# Altium schematic symbol library jlcpcb_2025_04_capacitors_extended_1206.schlib: 2503 symbols (part 8 of 14) (continued)
## CC1206KRX7R9BB333
designator C?  Capacitance: 33nF  (hidden comment: *)
Capacitor, Ceramic (MLCC), 33nF, ±10%, 50V, X7R, ±10%, SMD 1206; Manufacturer: YAGEO; Manufacturer Part Number: CC1206KRX7R9BB333; Package Size: 1206; JLCPCB Basic Part: No; JLCPCB Part Number: C541487; Supplier 1: LCSC; Category: Capacitors - MLCC; Supplier Part Number 1: C541487; Tolerance: ±10%; Voltage Rating: 50V; Temperature Coefficient: X7R; RoHS: Yes; ComponentLink1Description: Datasheet; ComponentLink1URL: https://wmsc.lcsc.com/wmsc/upload/file/pdf/v2/lcsc/2006151140_YAGEO-CC1206KRX7R9BB333_C541487.pdf; ComponentLink2Description: JLCPCB Part URL; ComponentLink2URL: https://jlcpcb.com/partdetail/C541487; ComponentLink3Description: LCSC Part URL; ComponentLink3URL: https://lcsc.com/product-detail/Multilayer-Ceramic-Capacitors-MLCC---SMD-SMT_YAGEO-YAGEO-CC1206KRX7R9BB333_C541487.html
footprint CAP-1206 (1206 (3216M) Capacitor)
pins: 1, 2

## CC1206KRX7R9BB334
designator C?  Capacitance: 330nF  (hidden comment: *)
Capacitor, Ceramic (MLCC), 330nF, ±10%, 50V, X7R, ±10%, SMD 1206; Manufacturer: YAGEO; Manufacturer Part Number: CC1206KRX7R9BB334; Package Size: 1206; JLCPCB Basic Part: No; JLCPCB Part Number: C274377; Supplier 1: LCSC; Category: Capacitors - MLCC; Supplier Part Number 1: C274377; Tolerance: ±10%; Voltage Rating: 50V; Temperature Coefficient: X7R; RoHS: Yes; ComponentLink1Description: Datasheet; ComponentLink1URL: https://wmsc.lcsc.com/wmsc/upload/file/pdf/v2/lcsc/2304140030_YAGEO-CC1206KRX7R9BB334_C274377.pdf; ComponentLink2Description: JLCPCB Part URL; ComponentLink2URL: https://jlcpcb.com/partdetail/C274377; ComponentLink3Description: LCSC Part URL; ComponentLink3URL: https://lcsc.com/product-detail/Multilayer-Ceramic-Capacitors-MLCC---SMD-SMT_YAGEO-YAGEO-CC1206KRX7R9BB334_C274377.html
footprint CAP-1206 (1206 (3216M) Capacitor)
pins: 1, 2

## CC1206KRX7R9BB391
designator C?  Capacitance: 390pF  (hidden comment: *)
Capacitor, Ceramic (MLCC), 390pF, ±10%, 50V, X7R, ±10%, SMD 1206; Manufacturer: YAGEO; Manufacturer Part Number: CC1206KRX7R9BB391; Package Size: 1206; JLCPCB Basic Part: No; JLCPCB Part Number: C527355; Supplier 1: LCSC; Category: Capacitors - MLCC; Supplier Part Number 1: C527355; Tolerance: ±10%; Voltage Rating: 50V; Temperature Coefficient: X7R; RoHS: Yes; ComponentLink1Description: Datasheet; ComponentLink1URL: https://wmsc.lcsc.com/wmsc/upload/file/pdf/v2/lcsc/2006101836_YAGEO-CC1206KRX7R9BB391_C527355.pdf; ComponentLink2Description: JLCPCB Part URL; ComponentLink2URL: https://jlcpcb.com/partdetail/C527355; ComponentLink3Description: LCSC Part URL; ComponentLink3URL: https://lcsc.com/product-detail/Multilayer-Ceramic-Capacitors-MLCC---SMD-SMT_YAGEO-YAGEO-CC1206KRX7R9BB391_C527355.html
footprint CAP-1206 (1206 (3216M) Capacitor)
pins: 1, 2

## CC1206KRX7R9BB392
designator C?  Capacitance: 3.9nF  (hidden comment: *)
Capacitor, Ceramic (MLCC), 3.9nF, ±10%, 50V, X7R, ±10%, SMD 1206; Manufacturer: YAGEO; Manufacturer Part Number: CC1206KRX7R9BB392; Package Size: 1206; JLCPCB Basic Part: No; JLCPCB Part Number: C527356; Supplier 1: LCSC; Category: Capacitors - MLCC; Supplier Part Number 1: C527356; Tolerance: ±10%; Voltage Rating: 50V; Temperature Coefficient: X7R; RoHS: Yes; ComponentLink1Description: Datasheet; ComponentLink1URL: https://wmsc.lcsc.com/wmsc/upload/file/pdf/v2/lcsc/2005222232_YAGEO-CC1206KRX7R9BB392_C527356.pdf; ComponentLink2Description: JLCPCB Part URL; ComponentLink2URL: https://jlcpcb.com/partdetail/C527356; ComponentLink3Description: LCSC Part URL; ComponentLink3URL: https://lcsc.com/product-detail/Multilayer-Ceramic-Capacitors-MLCC---SMD-SMT_YAGEO-YAGEO-CC1206KRX7R9BB392_C527356.html
footprint CAP-1206 (1206 (3216M) Capacitor)
pins: 1, 2

## CC1206KRX7R9BB393
designator C?  Capacitance: 39nF  (hidden comment: *)
Capacitor, Ceramic (MLCC), 39nF, ±10%, 50V, X7R, ±10%, SMD 1206; Manufacturer: YAGEO; Manufacturer Part Number: CC1206KRX7R9BB393; Package Size: 1206; JLCPCB Basic Part: No; JLCPCB Part Number: C527357; Supplier 1: LCSC; Category: Capacitors - MLCC; Supplier Part Number 1: C527357; Tolerance: ±10%; Voltage Rating: 50V; Temperature Coefficient: X7R; RoHS: Yes; ComponentLink1Description: Datasheet; ComponentLink1URL: https://wmsc.lcsc.com/wmsc/upload/file/pdf/v2/lcsc/2007021837_YAGEO-CC1206KRX7R9BB393_C527357.pdf; ComponentLink2Description: JLCPCB Part URL; ComponentLink2URL: https://jlcpcb.com/partdetail/C527357; ComponentLink3Description: LCSC Part URL; ComponentLink3URL: https://lcsc.com/product-detail/Multilayer-Ceramic-Capacitors-MLCC---SMD-SMT_YAGEO-YAGEO-CC1206KRX7R9BB393_C527357.html
footprint CAP-1206 (1206 (3216M) Capacitor)
pins: 1, 2

## CC1206KRX7R9BB471
designator C?  Capacitance: 470pF  (hidden comment: *)
Capacitor, Ceramic (MLCC), 470pF, ±10%, 50V, X7R, ±10%, SMD 1206; Manufacturer: YAGEO; Manufacturer Part Number: CC1206KRX7R9BB471; Package Size: 1206; JLCPCB Basic Part: No; JLCPCB Part Number: C326670; Supplier 1: LCSC; Category: Capacitors - MLCC; Supplier Part Number 1: C326670; Tolerance: ±10%; Voltage Rating: 50V; Temperature Coefficient: X7R; RoHS: Yes; ComponentLink1Description: Datasheet; ComponentLink1URL: https://wmsc.lcsc.com/wmsc/upload/file/pdf/v2/lcsc/1811141241_YAGEO-CC1206KRX7R9BB471_C326670.pdf; ComponentLink2Description: JLCPCB Part URL; ComponentLink2URL: https://jlcpcb.com/partdetail/C326670; ComponentLink3Description: LCSC Part URL; ComponentLink3URL: https://lcsc.com/product-detail/Multilayer-Ceramic-Capacitors-MLCC---SMD-SMT_YAGEO-YAGEO-CC1206KRX7R9BB471_C326670.html
footprint CAP-1206 (1206 (3216M) Capacitor)
pins: 1, 2

## CC1206KRX7R9BB472
designator C?  Capacitance: 4.7nF  (hidden comment: *)
Capacitor, Ceramic (MLCC), 4.7nF, ±10%, 50V, X7R, ±10%, SMD 1206; Manufacturer: YAGEO; Manufacturer Part Number: CC1206KRX7R9BB472; Package Size: 1206; JLCPCB Basic Part: No; JLCPCB Part Number: C107208; Supplier 1: LCSC; Category: Capacitors - MLCC; Supplier Part Number 1: C107208; Tolerance: ±10%; Voltage Rating: 50V; Temperature Coefficient: X7R; RoHS: Yes; ComponentLink1Description: Datasheet; ComponentLink1URL: https://wmsc.lcsc.com/wmsc/upload/file/pdf/v2/lcsc/2304140030_YAGEO-CC1206KRX7R9BB472_C107208.pdf; ComponentLink2Description: JLCPCB Part URL; ComponentLink2URL: https://jlcpcb.com/partdetail/C107208; ComponentLink3Description: LCSC Part URL; ComponentLink3URL: https://lcsc.com/product-detail/Multilayer-Ceramic-Capacitors-MLCC---SMD-SMT_YAGEO-YAGEO-CC1206KRX7R9BB472_C107208.html
footprint CAP-1206 (1206 (3216M) Capacitor)
pins: 1, 2

## CC1206KRX7R9BB473
designator C?  Capacitance: 47nF  (hidden comment: *)
Capacitor, Ceramic (MLCC), 47nF, ±10%, 50V, X7R, ±10%, SMD 1206; Manufacturer: YAGEO; Manufacturer Part Number: CC1206KRX7R9BB473; Package Size: 1206; JLCPCB Basic Part: No; JLCPCB Part Number: C107209; Supplier 1: LCSC; Category: Capacitors - MLCC; Supplier Part Number 1: C107209; Tolerance: ±10%; Voltage Rating: 50V; Temperature Coefficient: X7R; RoHS: Yes; ComponentLink1Description: Datasheet; ComponentLink1URL: https://wmsc.lcsc.com/wmsc/upload/file/pdf/v2/lcsc/2304140030_YAGEO-CC1206KRX7R9BB473_C107209.pdf; ComponentLink2Description: JLCPCB Part URL; ComponentLink2URL: https://jlcpcb.com/partdetail/C107209; ComponentLink3Description: LCSC Part URL; ComponentLink3URL: https://lcsc.com/product-detail/Multilayer-Ceramic-Capacitors-MLCC---SMD-SMT_YAGEO-YAGEO-CC1206KRX7R9BB473_C107209.html
footprint CAP-1206 (1206 (3216M) Capacitor)
pins: 1, 2

## CC1206KRX7R9BB561
designator C?  Capacitance: 560pF  (hidden comment: *)
Capacitor, Ceramic (MLCC), 560pF, ±10%, 50V, X7R, ±10%, SMD 1206; Manufacturer: YAGEO; Manufacturer Part Number: CC1206KRX7R9BB561; Package Size: 1206; JLCPCB Basic Part: No; JLCPCB Part Number: C541485; Supplier 1: LCSC; Category: Capacitors - MLCC; Supplier Part Number 1: C541485; Tolerance: ±10%; Voltage Rating: 50V; Temperature Coefficient: X7R; RoHS: Yes; ComponentLink1Description: Datasheet; ComponentLink1URL: https://wmsc.lcsc.com/wmsc/upload/file/pdf/v2/lcsc/2006151140_YAGEO-CC1206KRX7R9BB561_C541485.pdf; ComponentLink2Description: JLCPCB Part URL; ComponentLink2URL: https://jlcpcb.com/partdetail/C541485; ComponentLink3Description: LCSC Part URL; ComponentLink3URL: https://lcsc.com/product-detail/Multilayer-Ceramic-Capacitors-MLCC---SMD-SMT_YAGEO-YAGEO-CC1206KRX7R9BB561_C541485.html
footprint CAP-1206 (1206 (3216M) Capacitor)
pins: 1, 2

## CC1206KRX7R9BB562
designator C?  Capacitance: 5.6nF  (hidden comment: *)
Capacitor, Ceramic (MLCC), 5.6nF, ±10%, 50V, X7R, ±10%, SMD 1206; Manufacturer: YAGEO; Manufacturer Part Number: CC1206KRX7R9BB562; Package Size: 1206; JLCPCB Basic Part: No; JLCPCB Part Number: C327097; Supplier 1: LCSC; Category: Capacitors - MLCC; Supplier Part Number 1: C327097; Tolerance: ±10%; Voltage Rating: 50V; Temperature Coefficient: X7R; RoHS: Yes; ComponentLink1Description: Datasheet; ComponentLink1URL: https://wmsc.lcsc.com/wmsc/upload/file/pdf/v2/lcsc/2311211121_YAGEO-CC1206KRX7R9BB562_C327097.pdf; ComponentLink2Description: JLCPCB Part URL; ComponentLink2URL: https://jlcpcb.com/partdetail/C327097; ComponentLink3Description: LCSC Part URL; ComponentLink3URL: https://lcsc.com/product-detail/Multilayer-Ceramic-Capacitors-MLCC---SMD-SMT_YAGEO-YAGEO-CC1206KRX7R9BB562_C327097.html
footprint CAP-1206 (1206 (3216M) Capacitor)
pins: 1, 2

## CC1206KRX7R9BB563
designator C?  Capacitance: 56nF  (hidden comment: *)
Capacitor, Ceramic (MLCC), 56nF, ±10%, 50V, X7R, ±10%, SMD 1206; Manufacturer: YAGEO; Manufacturer Part Number: CC1206KRX7R9BB563; Package Size: 1206; JLCPCB Basic Part: No; JLCPCB Part Number: C541489; Supplier 1: LCSC; Category: Capacitors - MLCC; Supplier Part Number 1: C541489; Tolerance: ±10%; Voltage Rating: 50V; Temperature Coefficient: X7R; RoHS: Yes; ComponentLink1Description: Datasheet; ComponentLink1URL: https://wmsc.lcsc.com/wmsc/upload/file/pdf/v2/lcsc/2006151140_YAGEO-CC1206KRX7R9BB563_C541489.pdf; ComponentLink2Description: JLCPCB Part URL; ComponentLink2URL: https://jlcpcb.com/partdetail/C541489; ComponentLink3Description: LCSC Part URL; ComponentLink3URL: https://lcsc.com/product-detail/Multilayer-Ceramic-Capacitors-MLCC---SMD-SMT_YAGEO-YAGEO-CC1206KRX7R9BB563_C541489.html
footprint CAP-1206 (1206 (3216M) Capacitor)
pins: 1, 2

## CC1206KRX7R9BB682
designator C?  Capacitance: 6.8nF  (hidden comment: *)
Capacitor, Ceramic (MLCC), 6.8nF, ±10%, 50V, X7R, ±10%, SMD 1206; Manufacturer: YAGEO; Manufacturer Part Number: CC1206KRX7R9BB682; Package Size: 1206; JLCPCB Basic Part: No; JLCPCB Part Number: C113909; Supplier 1: LCSC; Category: Capacitors - MLCC; Supplier Part Number 1: C113909; Tolerance: ±10%; Voltage Rating: 50V; Temperature Coefficient: X7R; RoHS: Yes; ComponentLink1Description: Datasheet; ComponentLink1URL: https://wmsc.lcsc.com/wmsc/upload/file/pdf/v2/lcsc/2304140030_YAGEO-CC1206KRX7R9BB682_C113909.pdf; ComponentLink2Description: JLCPCB Part URL; ComponentLink2URL: https://jlcpcb.com/partdetail/C113909; ComponentLink3Description: LCSC Part URL; ComponentLink3URL: https://lcsc.com/product-detail/Multilayer-Ceramic-Capacitors-MLCC---SMD-SMT_YAGEO-YAGEO-CC1206KRX7R9BB682_C113909.html
footprint CAP-1206 (1206 (3216M) Capacitor)
pins: 1, 2

## CC1206KRX7R9BB683
designator C?  Capacitance: 68nF  (hidden comment: *)
Capacitor, Ceramic (MLCC), 68nF, ±10%, 50V, X7R, ±10%, SMD 1206; Manufacturer: YAGEO; Manufacturer Part Number: CC1206KRX7R9BB683; Package Size: 1206; JLCPCB Basic Part: No; JLCPCB Part Number: C107210; Supplier 1: LCSC; Category: Capacitors - MLCC; Supplier Part Number 1: C107210; Tolerance: ±10%; Voltage Rating: 50V; Temperature Coefficient: X7R; RoHS: Yes; ComponentLink1Description: Datasheet; ComponentLink1URL: https://wmsc.lcsc.com/wmsc/upload/file/pdf/v2/lcsc/2304140030_YAGEO-CC1206KRX7R9BB683_C107210.pdf; ComponentLink2Description: JLCPCB Part URL; ComponentLink2URL: https://jlcpcb.com/partdetail/C107210; ComponentLink3Description: LCSC Part URL; ComponentLink3URL: https://lcsc.com/product-detail/Multilayer-Ceramic-Capacitors-MLCC---SMD-SMT_YAGEO-YAGEO-CC1206KRX7R9BB683_C107210.html
footprint CAP-1206 (1206 (3216M) Capacitor)
pins: 1, 2

## CC1206KRX7R9BB821
designator C?  Capacitance: 820pF  (hidden comment: *)
Capacitor, Ceramic (MLCC), 820pF, ±10%, 50V, X7R, ±10%, SMD 1206; Manufacturer: YAGEO; Manufacturer Part Number: CC1206KRX7R9BB821; Package Size: 1206; JLCPCB Basic Part: No; JLCPCB Part Number: C541486; Supplier 1: LCSC; Category: Capacitors - MLCC; Supplier Part Number 1: C541486; Tolerance: ±10%; Voltage Rating: 50V; Temperature Coefficient: X7R; RoHS: Yes; ComponentLink1Description: Datasheet; ComponentLink1URL: https://wmsc.lcsc.com/wmsc/upload/file/pdf/v2/lcsc/2006151140_YAGEO-CC1206KRX7R9BB821_C541486.pdf; ComponentLink2Description: JLCPCB Part URL; ComponentLink2URL: https://jlcpcb.com/partdetail/C541486; ComponentLink3Description: LCSC Part URL; ComponentLink3URL: https://lcsc.com/product-detail/Multilayer-Ceramic-Capacitors-MLCC---SMD-SMT_YAGEO-YAGEO-CC1206KRX7R9BB821_C541486.html
footprint CAP-1206 (1206 (3216M) Capacitor)
pins: 1, 2

## CC1206KRX7R9BB822
designator C?  Capacitance: 8.2nF  (hidden comment: *)
Capacitor, Ceramic (MLCC), 8.2nF, ±10%, 50V, X7R, ±10%, SMD 1206; Manufacturer: YAGEO; Manufacturer Part Number: CC1206KRX7R9BB822; Package Size: 1206; JLCPCB Basic Part: No; JLCPCB Part Number: C527358; Supplier 1: LCSC; Category: Capacitors - MLCC; Supplier Part Number 1: C527358; Tolerance: ±10%; Voltage Rating: 50V; Temperature Coefficient: X7R; RoHS: Yes; ComponentLink1Description: Datasheet; ComponentLink1URL: https://wmsc.lcsc.com/wmsc/upload/file/pdf/v2/lcsc/2005222143_YAGEO-CC1206KRX7R9BB822_C527358.pdf; ComponentLink2Description: JLCPCB Part URL; ComponentLink2URL: https://jlcpcb.com/partdetail/C527358; ComponentLink3Description: LCSC Part URL; ComponentLink3URL: https://lcsc.com/product-detail/Multilayer-Ceramic-Capacitors-MLCC---SMD-SMT_YAGEO-YAGEO-CC1206KRX7R9BB822_C527358.html
footprint CAP-1206 (1206 (3216M) Capacitor)
pins: 1, 2

## CC1206KRX7R9BB823
designator C?  Capacitance: 82nF  (hidden comment: *)
Capacitor, Ceramic (MLCC), 82nF, ±10%, 50V, X7R, ±10%, SMD 1206; Manufacturer: YAGEO; Manufacturer Part Number: CC1206KRX7R9BB823; Package Size: 1206; JLCPCB Basic Part: No; JLCPCB Part Number: C527359; Supplier 1: LCSC; Category: Capacitors - MLCC; Supplier Part Number 1: C527359; Tolerance: ±10%; Voltage Rating: 50V; Temperature Coefficient: X7R; RoHS: Yes; ComponentLink1Description: Datasheet; ComponentLink1URL: https://wmsc.lcsc.com/wmsc/upload/file/pdf/v2/lcsc/2006031836_YAGEO-CC1206KRX7R9BB823_C527359.pdf; ComponentLink2Description: JLCPCB Part URL; ComponentLink2URL: https://jlcpcb.com/partdetail/C527359; ComponentLink3Description: LCSC Part URL; ComponentLink3URL: https://lcsc.com/product-detail/Multilayer-Ceramic-Capacitors-MLCC---SMD-SMT_YAGEO-YAGEO-CC1206KRX7R9BB823_C527359.html
footprint CAP-1206 (1206 (3216M) Capacitor)
pins: 1, 2

## CC1206KRX7RABB102
designator C?  Capacitance: 1nF  (hidden comment: *)
Capacitor, Ceramic (MLCC), 1nF, ±10%, 200V, X7R, ±10%, SMD 1206; Manufacturer: YAGEO; Manufacturer Part Number: CC1206KRX7RABB102; Package Size: 1206; JLCPCB Basic Part: No; JLCPCB Part Number: C113910; Supplier 1: LCSC; Category: Capacitors - MLCC; Supplier Part Number 1: C113910; Tolerance: ±10%; Voltage Rating: 200V; Temperature Coefficient: X7R; RoHS: Yes; ComponentLink1Description: Datasheet; ComponentLink1URL: https://wmsc.lcsc.com/wmsc/upload/file/pdf/v2/lcsc/2007141515_YAGEO-CC1206KRX7RABB102_C113910.pdf; ComponentLink2Description: JLCPCB Part URL; ComponentLink2URL: https://jlcpcb.com/partdetail/C113910; ComponentLink3Description: LCSC Part URL; ComponentLink3URL: https://lcsc.com/product-detail/Multilayer-Ceramic-Capacitors-MLCC---SMD-SMT_YAGEO-YAGEO-CC1206KRX7RABB102_C113910.html
footprint CAP-1206 (1206 (3216M) Capacitor)
pins: 1, 2

## CC1206KRX7RABB103
designator C?  Capacitance: 10nF  (hidden comment: *)
Capacitor, Ceramic (MLCC), 10nF, ±10%, 200V, X7R, ±10%, SMD 1206; Manufacturer: YAGEO; Manufacturer Part Number: CC1206KRX7RABB103; Package Size: 1206; JLCPCB Basic Part: No; JLCPCB Part Number: C326678; Supplier 1: LCSC; Category: Capacitors - MLCC; Supplier Part Number 1: C326678; Tolerance: ±10%; Voltage Rating: 200V; Temperature Coefficient: X7R; RoHS: Yes; ComponentLink1Description: Datasheet; ComponentLink1URL: https://wmsc.lcsc.com/wmsc/upload/file/pdf/v2/lcsc/1811141241_YAGEO-CC1206KRX7RABB103_C326678.pdf; ComponentLink2Description: JLCPCB Part URL; ComponentLink2URL: https://jlcpcb.com/partdetail/C326678; ComponentLink3Description: LCSC Part URL; ComponentLink3URL: https://lcsc.com/product-detail/Multilayer-Ceramic-Capacitors-MLCC---SMD-SMT_YAGEO-YAGEO-CC1206KRX7RABB103_C326678.html
footprint CAP-1206 (1206 (3216M) Capacitor)
pins: 1, 2

## CC1206KRX7RABB152
designator C?  Capacitance: 1.5nF  (hidden comment: *)
Capacitor, Ceramic (MLCC), 1.5nF, ±10%, 200V, X7R, ±10%, SMD 1206; Manufacturer: YAGEO; Manufacturer Part Number: CC1206KRX7RABB152; Package Size: 1206; JLCPCB Basic Part: No; JLCPCB Part Number: C527360; Supplier 1: LCSC; Category: Capacitors - MLCC; Supplier Part Number 1: C527360; Tolerance: ±10%; Voltage Rating: 200V; Temperature Coefficient: X7R; RoHS: Yes; ComponentLink1Description: Datasheet; ComponentLink1URL: https://wmsc.lcsc.com/wmsc/upload/file/pdf/v2/lcsc/2005262136_YAGEO-CC1206KRX7RABB152_C527360.pdf; ComponentLink2Description: JLCPCB Part URL; ComponentLink2URL: https://jlcpcb.com/partdetail/C527360; ComponentLink3Description: LCSC Part URL; ComponentLink3URL: https://lcsc.com/product-detail/Multilayer-Ceramic-Capacitors-MLCC---SMD-SMT_YAGEO-YAGEO-CC1206KRX7RABB152_C527360.html
footprint CAP-1206 (1206 (3216M) Capacitor)
pins: 1, 2

## CC1206KRX7RABB153
designator C?  Capacitance: 15nF  (hidden comment: *)
Capacitor, Ceramic (MLCC), 15nF, ±10%, 200V, X7R, ±10%, SMD 1206; Manufacturer: YAGEO; Manufacturer Part Number: CC1206KRX7RABB153; Package Size: 1206; JLCPCB Basic Part: No; JLCPCB Part Number: C527361; Supplier 1: LCSC; Category: Capacitors - MLCC; Supplier Part Number 1: C527361; Tolerance: ±10%; Voltage Rating: 200V; Temperature Coefficient: X7R; RoHS: Yes; ComponentLink1Description: Datasheet; ComponentLink1URL: https://wmsc.lcsc.com/wmsc/upload/file/pdf/v2/lcsc/2006031836_YAGEO-CC1206KRX7RABB153_C527361.pdf; ComponentLink2Description: JLCPCB Part URL; ComponentLink2URL: https://jlcpcb.com/partdetail/C527361; ComponentLink3Description: LCSC Part URL; ComponentLink3URL: https://lcsc.com/product-detail/Multilayer-Ceramic-Capacitors-MLCC---SMD-SMT_YAGEO-YAGEO-CC1206KRX7RABB153_C527361.html
footprint CAP-1206 (1206 (3216M) Capacitor)
pins: 1, 2

## CC1206KRX7RABB221
designator C?  Capacitance: 220pF  (hidden comment: *)
Capacitor, Ceramic (MLCC), 220pF, ±10%, 200V, X7R, ±10%, SMD 1206; Manufacturer: YAGEO; Manufacturer Part Number: CC1206KRX7RABB221; Package Size: 1206; JLCPCB Basic Part: No; JLCPCB Part Number: C326677; Supplier 1: LCSC; Category: Capacitors - MLCC; Supplier Part Number 1: C326677; Tolerance: ±10%; Voltage Rating: 200V; Temperature Coefficient: X7R; RoHS: Yes; ComponentLink1Description: Datasheet; ComponentLink1URL: https://wmsc.lcsc.com/wmsc/upload/file/pdf/v2/lcsc/1811061214_YAGEO-CC1206KRX7RABB221_C326677.pdf; ComponentLink2Description: JLCPCB Part URL; ComponentLink2URL: https://jlcpcb.com/partdetail/C326677; ComponentLink3Description: LCSC Part URL; ComponentLink3URL: https://lcsc.com/product-detail/Multilayer-Ceramic-Capacitors-MLCC---SMD-SMT_YAGEO-YAGEO-CC1206KRX7RABB221_C326677.html
footprint CAP-1206 (1206 (3216M) Capacitor)
pins: 1, 2

## CC1206KRX7RABB222
designator C?  Capacitance: 2.2nF  (hidden comment: *)
Capacitor, Ceramic (MLCC), 2.2nF, ±10%, 200V, X7R, ±10%, SMD 1206; Manufacturer: YAGEO; Manufacturer Part Number: CC1206KRX7RABB222; Package Size: 1206; JLCPCB Basic Part: No; JLCPCB Part Number: C326676; Supplier 1: LCSC; Category: Capacitors - MLCC; Supplier Part Number 1: C326676; Tolerance: ±10%; Voltage Rating: 200V; Temperature Coefficient: X7R; RoHS: Yes; ComponentLink1Description: Datasheet; ComponentLink1URL: https://wmsc.lcsc.com/wmsc/upload/file/pdf/v2/lcsc/1811091621_YAGEO-CC1206KRX7RABB222_C326676.pdf; ComponentLink2Description: JLCPCB Part URL; ComponentLink2URL: https://jlcpcb.com/partdetail/C326676; ComponentLink3Description: LCSC Part URL; ComponentLink3URL: https://lcsc.com/product-detail/Multilayer-Ceramic-Capacitors-MLCC---SMD-SMT_YAGEO-YAGEO-CC1206KRX7RABB222_C326676.html
footprint CAP-1206 (1206 (3216M) Capacitor)
pins: 1, 2

## CC1206KRX7RABB471
designator C?  Capacitance: 470pF  (hidden comment: *)
Capacitor, Ceramic (MLCC), 470pF, ±10%, 200V, X7R, ±10%, SMD 1206; Manufacturer: YAGEO; Manufacturer Part Number: CC1206KRX7RABB471; Package Size: 1206; JLCPCB Basic Part: No; JLCPCB Part Number: C277516; Supplier 1: LCSC; Category: Capacitors - MLCC; Supplier Part Number 1: C277516; Tolerance: ±10%; Voltage Rating: 200V; Temperature Coefficient: X7R; RoHS: Yes; ComponentLink1Description: Datasheet; ComponentLink1URL: https://wmsc.lcsc.com/wmsc/upload/file/pdf/v2/lcsc/2304140030_YAGEO-CC1206KRX7RABB471_C277516.pdf; ComponentLink2Description: JLCPCB Part URL; ComponentLink2URL: https://jlcpcb.com/partdetail/C277516; ComponentLink3Description: LCSC Part URL; ComponentLink3URL: https://lcsc.com/product-detail/Multilayer-Ceramic-Capacitors-MLCC---SMD-SMT_YAGEO-YAGEO-CC1206KRX7RABB471_C277516.html
footprint CAP-1206 (1206 (3216M) Capacitor)
pins: 1, 2

## CC1206KRX7RABB472
designator C?  Capacitance: 4.7nF  (hidden comment: *)
Capacitor, Ceramic (MLCC), 4.7nF, ±10%, 200V, X7R, ±10%, SMD 1206; Manufacturer: YAGEO; Manufacturer Part Number: CC1206KRX7RABB472; Package Size: 1206; JLCPCB Basic Part: No; JLCPCB Part Number: C326674; Supplier 1: LCSC; Category: Capacitors - MLCC; Supplier Part Number 1: C326674; Tolerance: ±10%; Voltage Rating: 200V; Temperature Coefficient: X7R; RoHS: Yes; ComponentLink1Description: Datasheet; ComponentLink1URL: https://wmsc.lcsc.com/wmsc/upload/file/pdf/v2/lcsc/1811061214_YAGEO-CC1206KRX7RABB472_C326674.pdf; ComponentLink2Description: JLCPCB Part URL; ComponentLink2URL: https://jlcpcb.com/partdetail/C326674; ComponentLink3Description: LCSC Part URL; ComponentLink3URL: https://lcsc.com/product-detail/Multilayer-Ceramic-Capacitors-MLCC---SMD-SMT_YAGEO-YAGEO-CC1206KRX7RABB472_C326674.html
footprint CAP-1206 (1206 (3216M) Capacitor)
pins: 1, 2

## CC1206KRX7RABB681
designator C?  Capacitance: 680pF  (hidden comment: *)
Capacitor, Ceramic (MLCC), 680pF, ±10%, 200V, X7R, ±10%, SMD 1206; Manufacturer: YAGEO; Manufacturer Part Number: CC1206KRX7RABB681; Package Size: 1206; JLCPCB Basic Part: No; JLCPCB Part Number: C326806; Supplier 1: LCSC; Category: Capacitors - MLCC; Supplier Part Number 1: C326806; Tolerance: ±10%; Voltage Rating: 200V; Temperature Coefficient: X7R; RoHS: Yes; ComponentLink1Description: Datasheet; ComponentLink1URL: https://wmsc.lcsc.com/wmsc/upload/file/pdf/v2/lcsc/1811061214_YAGEO-CC1206KRX7RABB681_C326806.pdf; ComponentLink2Description: JLCPCB Part URL; ComponentLink2URL: https://jlcpcb.com/partdetail/C326806; ComponentLink3Description: LCSC Part URL; ComponentLink3URL: https://lcsc.com/product-detail/Multilayer-Ceramic-Capacitors-MLCC---SMD-SMT_YAGEO-YAGEO-CC1206KRX7RABB681_C326806.html
footprint CAP-1206 (1206 (3216M) Capacitor)
pins: 1, 2

## CC1206KRX7RYBB102
designator C?  Capacitance: 1nF  (hidden comment: *)
Capacitor, Ceramic (MLCC), 1nF, ±10%, 250V, X7R, ±10%, SMD 1206; Manufacturer: YAGEO; Manufacturer Part Number: CC1206KRX7RYBB102; Package Size: 1206; JLCPCB Basic Part: No; JLCPCB Part Number: C107211; Supplier 1: LCSC; Category: Capacitors - MLCC; Supplier Part Number 1: C107211; Tolerance: ±10%; Voltage Rating: 250V; Temperature Coefficient: X7R; RoHS: Yes; ComponentLink1Description: Datasheet; ComponentLink1URL: https://wmsc.lcsc.com/wmsc/upload/file/pdf/v2/lcsc/2304140030_YAGEO-CC1206KRX7RYBB102_C107211.pdf; ComponentLink2Description: JLCPCB Part URL; ComponentLink2URL: https://jlcpcb.com/partdetail/C107211; ComponentLink3Description: LCSC Part URL; ComponentLink3URL: https://lcsc.com/product-detail/Multilayer-Ceramic-Capacitors-MLCC---SMD-SMT_YAGEO-YAGEO-CC1206KRX7RYBB102_C107211.html
footprint CAP-1206 (1206 (3216M) Capacitor)
pins: 1, 2

## CC1206KRX7RYBB103
designator C?  Capacitance: 10nF  (hidden comment: *)
Capacitor, Ceramic (MLCC), 10nF, ±10%, 250V, X7R, ±10%, SMD 1206; Manufacturer: YAGEO; Manufacturer Part Number: CC1206KRX7RYBB103; Package Size: 1206; JLCPCB Basic Part: No; JLCPCB Part Number: C326699; Supplier 1: LCSC; Category: Capacitors - MLCC; Supplier Part Number 1: C326699; Tolerance: ±10%; Voltage Rating: 250V; Temperature Coefficient: X7R; RoHS: Yes; ComponentLink1Description: Datasheet; ComponentLink1URL: https://wmsc.lcsc.com/wmsc/upload/file/pdf/v2/lcsc/1811061214_YAGEO-CC1206KRX7RYBB103_C326699.pdf; ComponentLink2Description: JLCPCB Part URL; ComponentLink2URL: https://jlcpcb.com/partdetail/C326699; ComponentLink3Description: LCSC Part URL; ComponentLink3URL: https://lcsc.com/product-detail/Multilayer-Ceramic-Capacitors-MLCC---SMD-SMT_YAGEO-YAGEO-CC1206KRX7RYBB103_C326699.html
footprint CAP-1206 (1206 (3216M) Capacitor)
pins: 1, 2

## CC1206KRX7RYBB153
designator C?  Capacitance: 15nF  (hidden comment: *)
Capacitor, Ceramic (MLCC), 15nF, ±10%, 250V, X7R, ±10%, SMD 1206; Manufacturer: YAGEO; Manufacturer Part Number: CC1206KRX7RYBB153; Package Size: 1206; JLCPCB Basic Part: No; JLCPCB Part Number: C326667; Supplier 1: LCSC; Category: Capacitors - MLCC; Supplier Part Number 1: C326667; Tolerance: ±10%; Voltage Rating: 250V; Temperature Coefficient: X7R; RoHS: Yes; ComponentLink1Description: Datasheet; ComponentLink1URL: https://wmsc.lcsc.com/wmsc/upload/file/pdf/v2/lcsc/1811151646_YAGEO-CC1206KRX7RYBB153_C326667.pdf; ComponentLink2Description: JLCPCB Part URL; ComponentLink2URL: https://jlcpcb.com/partdetail/C326667; ComponentLink3Description: LCSC Part URL; ComponentLink3URL: https://lcsc.com/product-detail/Multilayer-Ceramic-Capacitors-MLCC---SMD-SMT_YAGEO-YAGEO-CC1206KRX7RYBB153_C326667.html
footprint CAP-1206 (1206 (3216M) Capacitor)
pins: 1, 2

## CC1206KRX7RYBB222
designator C?  Capacitance: 2.2nF  (hidden comment: *)
Capacitor, Ceramic (MLCC), 2.2nF, ±10%, 250V, X7R, ±10%, SMD 1206; Manufacturer: YAGEO; Manufacturer Part Number: CC1206KRX7RYBB222; Package Size: 1206; JLCPCB Basic Part: No; JLCPCB Part Number: C113912; Supplier 1: LCSC; Category: Capacitors - MLCC; Supplier Part Number 1: C113912; Tolerance: ±10%; Voltage Rating: 250V; Temperature Coefficient: X7R; RoHS: Yes; ComponentLink1Description: Datasheet; ComponentLink1URL: https://wmsc.lcsc.com/wmsc/upload/file/pdf/v2/lcsc/2304140030_YAGEO-CC1206KRX7RYBB222_C113912.pdf; ComponentLink2Description: JLCPCB Part URL; ComponentLink2URL: https://jlcpcb.com/partdetail/C113912; ComponentLink3Description: LCSC Part URL; ComponentLink3URL: https://lcsc.com/product-detail/Multilayer-Ceramic-Capacitors-MLCC---SMD-SMT_YAGEO-YAGEO-CC1206KRX7RYBB222_C113912.html
footprint CAP-1206 (1206 (3216M) Capacitor)
pins: 1, 2

## CC1206KRX7RYBB332
designator C?  Capacitance: 3.3nF  (hidden comment: *)
Capacitor, Ceramic (MLCC), 3.3nF, ±10%, 250V, X7R, ±10%, SMD 1206; Manufacturer: YAGEO; Manufacturer Part Number: CC1206KRX7RYBB332; Package Size: 1206; JLCPCB Basic Part: No; JLCPCB Part Number: C326675; Supplier 1: LCSC; Category: Capacitors - MLCC; Supplier Part Number 1: C326675; Tolerance: ±10%; Voltage Rating: 250V; Temperature Coefficient: X7R; RoHS: Yes; ComponentLink1Description: Datasheet; ComponentLink1URL: https://wmsc.lcsc.com/wmsc/upload/file/pdf/v2/lcsc/1811151646_YAGEO-CC1206KRX7RYBB332_C326675.pdf; ComponentLink2Description: JLCPCB Part URL; ComponentLink2URL: https://jlcpcb.com/partdetail/C326675; ComponentLink3Description: LCSC Part URL; ComponentLink3URL: https://lcsc.com/product-detail/Multilayer-Ceramic-Capacitors-MLCC---SMD-SMT_YAGEO-YAGEO-CC1206KRX7RYBB332_C326675.html
footprint CAP-1206 (1206 (3216M) Capacitor)
pins: 1, 2

## CC1206KRX7RYBB471
designator C?  Capacitance: 470pF  (hidden comment: *)
Capacitor, Ceramic (MLCC), 470pF, ±10%, 250V, X7R, ±10%, SMD 1206; Manufacturer: YAGEO; Manufacturer Part Number: CC1206KRX7RYBB471; Package Size: 1206; JLCPCB Basic Part: No; JLCPCB Part Number: C107212; Supplier 1: LCSC; Category: Capacitors - MLCC; Supplier Part Number 1: C107212; Tolerance: ±10%; Voltage Rating: 250V; Temperature Coefficient: X7R; RoHS: Yes; ComponentLink1Description: Datasheet; ComponentLink1URL: https://wmsc.lcsc.com/wmsc/upload/file/pdf/v2/lcsc/2304140030_YAGEO-CC1206KRX7RYBB471_C107212.pdf; ComponentLink2Description: JLCPCB Part URL; ComponentLink2URL: https://jlcpcb.com/partdetail/C107212; ComponentLink3Description: LCSC Part URL; ComponentLink3URL: https://lcsc.com/product-detail/Multilayer-Ceramic-Capacitors-MLCC---SMD-SMT_YAGEO-YAGEO-CC1206KRX7RYBB471_C107212.html
footprint CAP-1206 (1206 (3216M) Capacitor)
pins: 1, 2

## CC1206KRX7RYBB472
designator C?  Capacitance: 4.7nF  (hidden comment: *)
Capacitor, Ceramic (MLCC), 4.7nF, ±10%, 250V, X7R, ±10%, SMD 1206; Manufacturer: YAGEO; Manufacturer Part Number: CC1206KRX7RYBB472; Package Size: 1206; JLCPCB Basic Part: No; JLCPCB Part Number: C326763; Supplier 1: LCSC; Category: Capacitors - MLCC; Supplier Part Number 1: C326763; Tolerance: ±10%; Voltage Rating: 250V; Temperature Coefficient: X7R; RoHS: Yes; ComponentLink1Description: Datasheet; ComponentLink1URL: https://wmsc.lcsc.com/wmsc/upload/file/pdf/v2/lcsc/1811151646_YAGEO-CC1206KRX7RYBB472_C326763.pdf; ComponentLink2Description: JLCPCB Part URL; ComponentLink2URL: https://jlcpcb.com/partdetail/C326763; ComponentLink3Description: LCSC Part URL; ComponentLink3URL: https://lcsc.com/product-detail/Multilayer-Ceramic-Capacitors-MLCC---SMD-SMT_YAGEO-YAGEO-CC1206KRX7RYBB472_C326763.html
footprint CAP-1206 (1206 (3216M) Capacitor)
pins: 1, 2

## CC1206KRX7RYBB561
designator C?  Capacitance: 560pF  (hidden comment: *)
Capacitor, Ceramic (MLCC), 560pF, ±10%, 250V, X7R, ±10%, SMD 1206; Manufacturer: YAGEO; Manufacturer Part Number: CC1206KRX7RYBB561; Package Size: 1206; JLCPCB Basic Part: No; JLCPCB Part Number: C527362; Supplier 1: LCSC; Category: Capacitors - MLCC; Supplier Part Number 1: C527362; Tolerance: ±10%; Voltage Rating: 250V; Temperature Coefficient: X7R; RoHS: Yes; ComponentLink1Description: Datasheet; ComponentLink1URL: https://wmsc.lcsc.com/wmsc/upload/file/pdf/v2/lcsc/2009180903_YAGEO-CC1206KRX7RYBB561_C527362.pdf; ComponentLink2Description: JLCPCB Part URL; ComponentLink2URL: https://jlcpcb.com/partdetail/C527362; ComponentLink3Description: LCSC Part URL; ComponentLink3URL: https://lcsc.com/product-detail/Multilayer-Ceramic-Capacitors-MLCC---SMD-SMT_YAGEO-YAGEO-CC1206KRX7RYBB561_C527362.html
footprint CAP-1206 (1206 (3216M) Capacitor)
pins: 1, 2

## CC1206MKX5R5BB107
designator C?  Capacitance: 100uF  (hidden comment: *)
Capacitor, Ceramic (MLCC), 100uF, ±20%, 6.3V, X5R, ±20%, SMD 1206; Manufacturer: YAGEO; Manufacturer Part Number: CC1206MKX5R5BB107; Package Size: 1206; JLCPCB Basic Part: No; JLCPCB Part Number: C110048; Supplier 1: LCSC; Category: Capacitors - MLCC; Supplier Part Number 1: C110048; Tolerance: ±20%; Voltage Rating: 6.3V; Temperature Coefficient: X5R; RoHS: Yes; ComponentLink1Description: Datasheet; ComponentLink1URL: https://wmsc.lcsc.com/wmsc/upload/file/pdf/v2/lcsc/2407081117_YAGEO-CC1206MKX5R5BB107_C110048.pdf; ComponentLink2Description: JLCPCB Part URL; ComponentLink2URL: https://jlcpcb.com/partdetail/C110048; ComponentLink3Description: LCSC Part URL; ComponentLink3URL: https://lcsc.com/product-detail/Multilayer-Ceramic-Capacitors-MLCC---SMD-SMT_YAGEO-YAGEO-CC1206MKX5R5BB107_C110048.html
footprint CAP-1206 (1206 (3216M) Capacitor)
pins: 1, 2

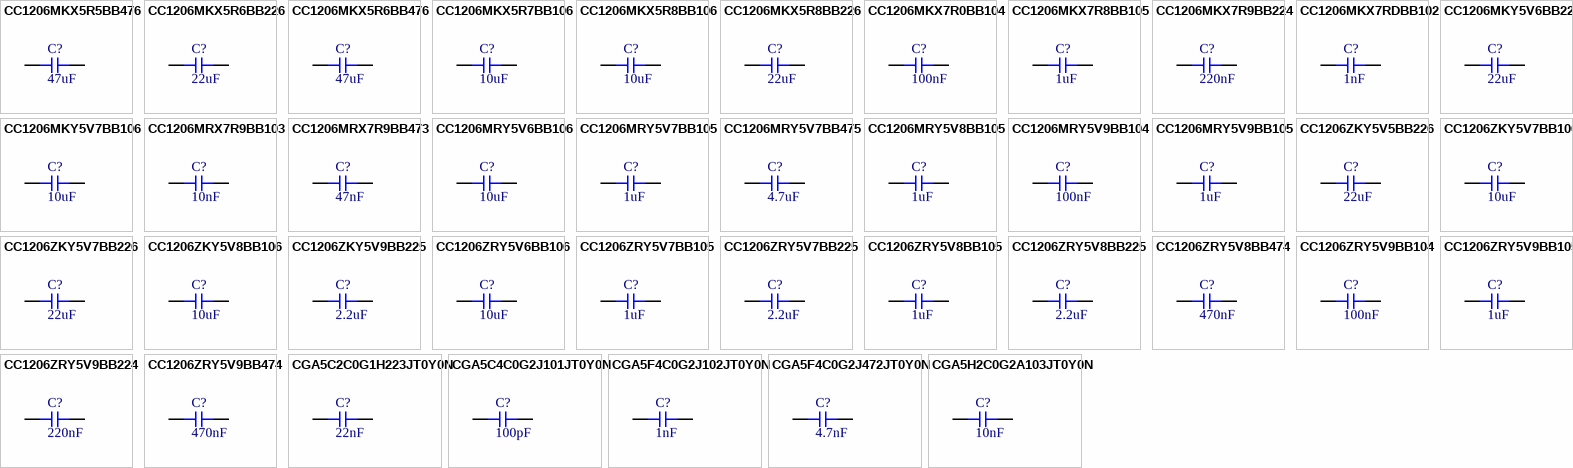
[diagram p34: symbols CC1206MKX5R5BB476 to CGA5H2C0G2A103JT0Y0N]

## CC1206MKX5R5BB476
designator C?  Capacitance: 47uF  (hidden comment: *)
Capacitor, Ceramic (MLCC), 47uF, ±20%, 6.3V, X5R, ±20%, SMD 1206; Manufacturer: YAGEO; Manufacturer Part Number: CC1206MKX5R5BB476; Package Size: 1206; JLCPCB Basic Part: No; JLCPCB Part Number: C110047; Supplier 1: LCSC; Category: Capacitors - MLCC; Supplier Part Number 1: C110047; Tolerance: ±20%; Voltage Rating: 6.3V; Temperature Coefficient: X5R; RoHS: Yes; ComponentLink1Description: Datasheet; ComponentLink1URL: https://wmsc.lcsc.com/wmsc/upload/file/pdf/v2/lcsc/2407081117_YAGEO-CC1206MKX5R5BB476_C110047.pdf; ComponentLink2Description: JLCPCB Part URL; ComponentLink2URL: https://jlcpcb.com/partdetail/C110047; ComponentLink3Description: LCSC Part URL; ComponentLink3URL: https://lcsc.com/product-detail/Multilayer-Ceramic-Capacitors-MLCC---SMD-SMT_YAGEO-YAGEO-CC1206MKX5R5BB476_C110047.html
footprint CAP-1206 (1206 (3216M) Capacitor)
pins: 1, 2

## CC1206MKX5R6BB226
designator C?  Capacitance: 22uF  (hidden comment: *)
Capacitor, Ceramic (MLCC), 22uF, ±20%, 10V, X5R, ±20%, SMD 1206; Manufacturer: YAGEO; Manufacturer Part Number: CC1206MKX5R6BB226; Package Size: 1206; JLCPCB Basic Part: No; JLCPCB Part Number: C723738; Supplier 1: LCSC; Category: Capacitors - MLCC; Supplier Part Number 1: C723738; Tolerance: ±20%; Voltage Rating: 10V; Temperature Coefficient: X5R; RoHS: Yes; ComponentLink1Description: Datasheet; ComponentLink1URL: https://wmsc.lcsc.com/wmsc/upload/file/pdf/v2/lcsc/2407081117_YAGEO-CC1206MKX5R6BB226_C723738.pdf; ComponentLink2Description: JLCPCB Part URL; ComponentLink2URL: https://jlcpcb.com/partdetail/C723738; ComponentLink3Description: LCSC Part URL; ComponentLink3URL: https://lcsc.com/product-detail/Multilayer-Ceramic-Capacitors-MLCC---SMD-SMT_YAGEO-YAGEO-CC1206MKX5R6BB226_C723738.html
footprint CAP-1206 (1206 (3216M) Capacitor)
pins: 1, 2

## CC1206MKX5R6BB476
designator C?  Capacitance: 47uF  (hidden comment: *)
Capacitor, Ceramic (MLCC), 47uF, ±20%, 10V, X5R, ±20%, SMD 1206; Manufacturer: YAGEO; Manufacturer Part Number: CC1206MKX5R6BB476; Package Size: 1206; JLCPCB Basic Part: No; JLCPCB Part Number: C513711; Supplier 1: LCSC; Category: Capacitors - MLCC; Supplier Part Number 1: C513711; Tolerance: ±20%; Voltage Rating: 10V; Temperature Coefficient: X5R; RoHS: Yes; ComponentLink1Description: Datasheet; ComponentLink1URL: https://wmsc.lcsc.com/wmsc/upload/file/pdf/v2/lcsc/2407081117_YAGEO-CC1206MKX5R6BB476_C513711.pdf; ComponentLink2Description: JLCPCB Part URL; ComponentLink2URL: https://jlcpcb.com/partdetail/C513711; ComponentLink3Description: LCSC Part URL; ComponentLink3URL: https://lcsc.com/product-detail/Multilayer-Ceramic-Capacitors-MLCC---SMD-SMT_YAGEO-YAGEO-CC1206MKX5R6BB476_C513711.html
footprint CAP-1206 (1206 (3216M) Capacitor)
pins: 1, 2

## CC1206MKX5R7BB106
designator C?  Capacitance: 10uF  (hidden comment: *)
Capacitor, Ceramic (MLCC), 10uF, ±20%, 16V, X5R, ±20%, SMD 1206; Manufacturer: YAGEO; Manufacturer Part Number: CC1206MKX5R7BB106; Package Size: 1206; JLCPCB Basic Part: No; JLCPCB Part Number: C2179145; Supplier 1: LCSC; Category: Capacitors - MLCC; Supplier Part Number 1: C2179145; Tolerance: ±20%; Voltage Rating: 16V; Temperature Coefficient: X5R; RoHS: Yes; ComponentLink1Description: Datasheet; ComponentLink1URL: https://wmsc.lcsc.com/wmsc/upload/file/pdf/v2/lcsc/2407081117_YAGEO-CC1206MKX5R7BB106_C2179145.pdf; ComponentLink2Description: JLCPCB Part URL; ComponentLink2URL: https://jlcpcb.com/partdetail/C2179145; ComponentLink3Description: LCSC Part URL; ComponentLink3URL: https://lcsc.com/product-detail/Multilayer-Ceramic-Capacitors-MLCC---SMD-SMT_YAGEO-YAGEO-CC1206MKX5R7BB106_C2179145.html
footprint CAP-1206 (1206 (3216M) Capacitor)
pins: 1, 2

## CC1206MKX5R8BB106
designator C?  Capacitance: 10uF  (hidden comment: *)
Capacitor, Ceramic (MLCC), 10uF, ±20%, 25V, X5R, ±20%, SMD 1206; Manufacturer: YAGEO; Manufacturer Part Number: CC1206MKX5R8BB106; Package Size: 1206; JLCPCB Basic Part: No; JLCPCB Part Number: C723739; Supplier 1: LCSC; Category: Capacitors - MLCC; Supplier Part Number 1: C723739; Tolerance: ±20%; Voltage Rating: 25V; Temperature Coefficient: X5R; RoHS: Yes; ComponentLink1Description: Datasheet; ComponentLink1URL: https://wmsc.lcsc.com/wmsc/upload/file/pdf/v2/lcsc/2407081117_YAGEO-CC1206MKX5R8BB106_C723739.pdf; ComponentLink2Description: JLCPCB Part URL; ComponentLink2URL: https://jlcpcb.com/partdetail/C723739; ComponentLink3Description: LCSC Part URL; ComponentLink3URL: https://lcsc.com/product-detail/Multilayer-Ceramic-Capacitors-MLCC---SMD-SMT_YAGEO-YAGEO-CC1206MKX5R8BB106_C723739.html
footprint CAP-1206 (1206 (3216M) Capacitor)
pins: 1, 2

## CC1206MKX5R8BB226
designator C?  Capacitance: 22uF  (hidden comment: *)
Capacitor, Ceramic (MLCC), 22uF, ±20%, 25V, X5R, ±20%, SMD 1206; Manufacturer: YAGEO; Manufacturer Part Number: CC1206MKX5R8BB226; Package Size: 1206; JLCPCB Basic Part: No; JLCPCB Part Number: C723460; Supplier 1: LCSC; Category: Capacitors - MLCC; Supplier Part Number 1: C723460; Tolerance: ±20%; Voltage Rating: 25V; Temperature Coefficient: X5R; RoHS: Yes; ComponentLink1Description: Datasheet; ComponentLink1URL: https://wmsc.lcsc.com/wmsc/upload/file/pdf/v2/lcsc/2407081117_YAGEO-CC1206MKX5R8BB226_C723460.pdf; ComponentLink2Description: JLCPCB Part URL; ComponentLink2URL: https://jlcpcb.com/partdetail/C723460; ComponentLink3Description: LCSC Part URL; ComponentLink3URL: https://lcsc.com/product-detail/Multilayer-Ceramic-Capacitors-MLCC---SMD-SMT_YAGEO-YAGEO-CC1206MKX5R8BB226_C723460.html
footprint CAP-1206 (1206 (3216M) Capacitor)
pins: 1, 2

## CC1206MKX7R0BB104
designator C?  Capacitance: 100nF  (hidden comment: *)
Capacitor, Ceramic (MLCC), 100nF, ±20%, 100V, X7R, ±20%, SMD 1206; Manufacturer: YAGEO; Manufacturer Part Number: CC1206MKX7R0BB104; Package Size: 1206; JLCPCB Basic Part: No; JLCPCB Part Number: C2170390; Supplier 1: LCSC; Category: Capacitors - MLCC; Supplier Part Number 1: C2170390; Tolerance: ±20%; Voltage Rating: 100V; Temperature Coefficient: X7R; RoHS: Yes; ComponentLink1Description: Datasheet; ComponentLink1URL: https://wmsc.lcsc.com/wmsc/upload/file/pdf/v2/lcsc/2202040430_YAGEO-CC1206MKX7R0BB104_C2170390.pdf; ComponentLink2Description: JLCPCB Part URL; ComponentLink2URL: https://jlcpcb.com/partdetail/C2170390; ComponentLink3Description: LCSC Part URL; ComponentLink3URL: https://lcsc.com/product-detail/Multilayer-Ceramic-Capacitors-MLCC---SMD-SMT_YAGEO-YAGEO-CC1206MKX7R0BB104_C2170390.html
footprint CAP-1206 (1206 (3216M) Capacitor)
pins: 1, 2

## CC1206MKX7R8BB105
designator C?  Capacitance: 1uF  (hidden comment: *)
Capacitor, Ceramic (MLCC), 1uF, ±20%, 25V, X7R, ±20%, SMD 1206; Manufacturer: YAGEO; Manufacturer Part Number: CC1206MKX7R8BB105; Package Size: 1206; JLCPCB Basic Part: No; JLCPCB Part Number: C577248; Supplier 1: LCSC; Category: Capacitors - MLCC; Supplier Part Number 1: C577248; Tolerance: ±20%; Voltage Rating: 25V; Temperature Coefficient: X7R; RoHS: Yes; ComponentLink1Description: Datasheet; ComponentLink1URL: https://wmsc.lcsc.com/wmsc/upload/file/pdf/v2/lcsc/2204121100_YAGEO-CC1206MKX7R8BB105_C577248.pdf; ComponentLink2Description: JLCPCB Part URL; ComponentLink2URL: https://jlcpcb.com/partdetail/C577248; ComponentLink3Description: LCSC Part URL; ComponentLink3URL: https://lcsc.com/product-detail/Multilayer-Ceramic-Capacitors-MLCC---SMD-SMT_YAGEO-YAGEO-CC1206MKX7R8BB105_C577248.html
footprint CAP-1206 (1206 (3216M) Capacitor)
pins: 1, 2

## CC1206MKX7R9BB224
designator C?  Capacitance: 220nF  (hidden comment: *)
Capacitor, Ceramic (MLCC), 220nF, ±20%, 50V, X7R, ±20%, SMD 1206; Manufacturer: YAGEO; Manufacturer Part Number: CC1206MKX7R9BB224; Package Size: 1206; JLCPCB Basic Part: No; JLCPCB Part Number: C726634; Supplier 1: LCSC; Category: Capacitors - MLCC; Supplier Part Number 1: C726634; Tolerance: ±20%; Voltage Rating: 50V; Temperature Coefficient: X7R; RoHS: Yes; ComponentLink1Description: Datasheet; ComponentLink1URL: https://wmsc.lcsc.com/wmsc/upload/file/pdf/v2/lcsc/2204282016_YAGEO-CC1206MKX7R9BB224_C726634.pdf; ComponentLink2Description: JLCPCB Part URL; ComponentLink2URL: https://jlcpcb.com/partdetail/C726634; ComponentLink3Description: LCSC Part URL; ComponentLink3URL: https://lcsc.com/product-detail/Multilayer-Ceramic-Capacitors-MLCC---SMD-SMT_YAGEO-YAGEO-CC1206MKX7R9BB224_C726634.html
footprint CAP-1206 (1206 (3216M) Capacitor)
pins: 1, 2

## CC1206MKX7RDBB102
designator C?  Capacitance: 1nF  (hidden comment: *)
Capacitor, Ceramic (MLCC), 1nF, ±20%, 2kV, X7R, ±20%, SMD 1206; Manufacturer: YAGEO; Manufacturer Part Number: CC1206MKX7RDBB102; Package Size: 1206; JLCPCB Basic Part: No; JLCPCB Part Number: C527363; Supplier 1: LCSC; Category: Capacitors - MLCC; Supplier Part Number 1: C527363; Tolerance: ±20%; Voltage Rating: 2kV; Temperature Coefficient: X7R; RoHS: Yes; ComponentLink1Description: Datasheet; ComponentLink1URL: https://wmsc.lcsc.com/wmsc/upload/file/pdf/v2/lcsc/2006101836_YAGEO-CC1206MKX7RDBB102_C527363.pdf; ComponentLink2Description: JLCPCB Part URL; ComponentLink2URL: https://jlcpcb.com/partdetail/C527363; ComponentLink3Description: LCSC Part URL; ComponentLink3URL: https://lcsc.com/product-detail/Multilayer-Ceramic-Capacitors-MLCC---SMD-SMT_YAGEO-YAGEO-CC1206MKX7RDBB102_C527363.html
footprint CAP-1206 (1206 (3216M) Capacitor)
pins: 1, 2

## CC1206MKY5V6BB226
designator C?  Capacitance: 22uF  (hidden comment: *)
Capacitor, Ceramic (MLCC), 22uF, ±20%, 10V, Y5V, ±20%, SMD 1206; Manufacturer: YAGEO; Manufacturer Part Number: CC1206MKY5V6BB226; Package Size: 1206; JLCPCB Basic Part: No; JLCPCB Part Number: C541523; Supplier 1: LCSC; Category: Capacitors - MLCC; Supplier Part Number 1: C541523; Tolerance: ±20%; Voltage Rating: 10V; Temperature Coefficient: Y5V; RoHS: Yes; ComponentLink1Description: Datasheet; ComponentLink1URL: https://wmsc.lcsc.com/wmsc/upload/file/pdf/v2/lcsc/2006151143_YAGEO-CC1206MKY5V6BB226_C541523.pdf; ComponentLink2Description: JLCPCB Part URL; ComponentLink2URL: https://jlcpcb.com/partdetail/C541523; ComponentLink3Description: LCSC Part URL; ComponentLink3URL: https://lcsc.com/product-detail/Multilayer-Ceramic-Capacitors-MLCC---SMD-SMT_YAGEO-YAGEO-CC1206MKY5V6BB226_C541523.html
footprint CAP-1206 (1206 (3216M) Capacitor)
pins: 1, 2

## CC1206MKY5V7BB106
designator C?  Capacitance: 10uF  (hidden comment: *)
Capacitor, Ceramic (MLCC), 10uF, ±20%, 16V, Y5V, ±20%, SMD 1206; Manufacturer: YAGEO; Manufacturer Part Number: CC1206MKY5V7BB106; Package Size: 1206; JLCPCB Basic Part: No; JLCPCB Part Number: C527364; Supplier 1: LCSC; Category: Capacitors - MLCC; Supplier Part Number 1: C527364; Tolerance: ±20%; Voltage Rating: 16V; Temperature Coefficient: Y5V; RoHS: Yes; ComponentLink1Description: Datasheet; ComponentLink1URL: https://wmsc.lcsc.com/wmsc/upload/file/pdf/v2/lcsc/2006031836_YAGEO-CC1206MKY5V7BB106_C527364.pdf; ComponentLink2Description: JLCPCB Part URL; ComponentLink2URL: https://jlcpcb.com/partdetail/C527364; ComponentLink3Description: LCSC Part URL; ComponentLink3URL: https://lcsc.com/product-detail/Multilayer-Ceramic-Capacitors-MLCC---SMD-SMT_YAGEO-YAGEO-CC1206MKY5V7BB106_C527364.html
footprint CAP-1206 (1206 (3216M) Capacitor)
pins: 1, 2

## CC1206MRX7R9BB103
designator C?  Capacitance: 10nF  (hidden comment: *)
Capacitor, Ceramic (MLCC), 10nF, ±20%, 50V, X7R, ±20%, SMD 1206; Manufacturer: YAGEO; Manufacturer Part Number: CC1206MRX7R9BB103; Package Size: 1206; JLCPCB Basic Part: No; JLCPCB Part Number: C1854200; Supplier 1: LCSC; Category: Capacitors - MLCC; Supplier Part Number 1: C1854200; Tolerance: ±20%; Voltage Rating: 50V; Temperature Coefficient: X7R; RoHS: Yes; ComponentLink1Description: Datasheet; ComponentLink1URL: https://wmsc.lcsc.com/wmsc/upload/file/pdf/v2/lcsc/2201271130_YAGEO-CC1206MRX7R9BB103_C1854200.pdf; ComponentLink2Description: JLCPCB Part URL; ComponentLink2URL: https://jlcpcb.com/partdetail/C1854200; ComponentLink3Description: LCSC Part URL; ComponentLink3URL: https://lcsc.com/product-detail/Multilayer-Ceramic-Capacitors-MLCC---SMD-SMT_YAGEO-YAGEO-CC1206MRX7R9BB103_C1854200.html
footprint CAP-1206 (1206 (3216M) Capacitor)
pins: 1, 2
